# Altium schematic symbol library jlcpcb_2025_04_capacitors_extended_0402.schlib: 3594 symbols (part 11 of 20) (continued)
## CL05F104ZO5NNNC
designator C?  Capacitance: 100nF  (hidden comment: *)
Capacitor, Ceramic (MLCC), 100nF, 16V, Y5V, SMD 0402; Manufacturer: Samsung Electro-Mechanics; Manufacturer Part Number: CL05F104ZO5NNNC; Temperature Rating: -20%~+80%; Package Size: 0402; JLCPCB Basic Part: No; JLCPCB Part Number: C84701; Supplier 1: LCSC; Category: Capacitors - MLCC; Supplier Part Number 1: C84701; Voltage Rating: 16V; Temperature Coefficient: Y5V; RoHS: Yes; ComponentLink1Description: Datasheet; ComponentLink1URL: https://wmsc.lcsc.com/wmsc/upload/file/pdf/v2/lcsc/2304140030_Samsung-Electro-Mechanics-CL05F104ZO5NNNC_C84701.pdf; ComponentLink2Description: JLCPCB Part URL; ComponentLink2URL: https://jlcpcb.com/partdetail/C84701; ComponentLink3Description: LCSC Part URL; ComponentLink3URL: https://lcsc.com/product-detail/Multilayer-Ceramic-Capacitors-MLCC---SMD-SMT_Samsung-Electro-Mechanics-Samsung-Electro-Mechanics-CL05F104ZO5NNNC_C84701.html; ComponentLink4Description: Samsung Component Library; ComponentLink4URL: https://weblib.samsungsem.com/mlcc/mlcc-ec.do?partNumber=CL05F104ZO5NNN
footprint CAP-0402 (0402 (1005M) Capacitor)
pins: 1, 2

## CL05F224ZO5NNNC
designator C?  Capacitance: 220nF  (hidden comment: *)
Capacitor, Ceramic (MLCC), 220nF, 16V, Y5V, SMD 0402; Manufacturer: Samsung Electro-Mechanics; Manufacturer Part Number: CL05F224ZO5NNNC; Temperature Rating: -20%~+80%; Package Size: 0402; JLCPCB Basic Part: No; JLCPCB Part Number: C296712; Supplier 1: LCSC; Category: Capacitors - MLCC; Supplier Part Number 1: C296712; Voltage Rating: 16V; Temperature Coefficient: Y5V; RoHS: Yes; ComponentLink1Description: Datasheet; ComponentLink1URL: https://wmsc.lcsc.com/wmsc/upload/file/pdf/v2/lcsc/2304140030_Samsung-Electro-Mechanics-CL05F224ZO5NNNC_C296712.pdf; ComponentLink2Description: JLCPCB Part URL; ComponentLink2URL: https://jlcpcb.com/partdetail/C296712; ComponentLink3Description: LCSC Part URL; ComponentLink3URL: https://lcsc.com/product-detail/Multilayer-Ceramic-Capacitors-MLCC---SMD-SMT_Samsung-Electro-Mechanics-Samsung-Electro-Mechanics-CL05F224ZO5NNNC_C296712.html; ComponentLink4Description: Samsung Component Library; ComponentLink4URL: https://weblib.samsungsem.com/mlcc/mlcc-ec.do?partNumber=CL05F224ZO5NNN
footprint CAP-0402 (0402 (1005M) Capacitor)
pins: 1, 2

## CL05F224ZP5NNNC
designator C?  Capacitance: 220nF  (hidden comment: *)
Capacitor, Ceramic (MLCC), 220nF, 10V, Y5V, SMD 0402; Manufacturer: Samsung Electro-Mechanics; Manufacturer Part Number: CL05F224ZP5NNNC; Temperature Rating: -20%~+80%; Package Size: 0402; JLCPCB Basic Part: No; JLCPCB Part Number: C318602; Supplier 1: LCSC; Category: Capacitors - MLCC; Supplier Part Number 1: C318602; Voltage Rating: 10V; Temperature Coefficient: Y5V; RoHS: Yes; ComponentLink1Description: Datasheet; ComponentLink1URL: https://wmsc.lcsc.com/wmsc/upload/file/pdf/v2/lcsc/2304140030_Samsung-Electro-Mechanics-CL05F224ZP5NNNC_C318602.pdf; ComponentLink2Description: JLCPCB Part URL; ComponentLink2URL: https://jlcpcb.com/partdetail/C318602; ComponentLink3Description: LCSC Part URL; ComponentLink3URL: https://lcsc.com/product-detail/Multilayer-Ceramic-Capacitors-MLCC---SMD-SMT_Samsung-Electro-Mechanics-Samsung-Electro-Mechanics-CL05F224ZP5NNNC_C318602.html; ComponentLink4Description: Samsung Component Library; ComponentLink4URL: https://weblib.samsungsem.com/mlcc/mlcc-ec.do?partNumber=CL05F224ZP5NNN
footprint CAP-0402 (0402 (1005M) Capacitor)
pins: 1, 2

## CL05X105KA5NQNC
designator C?  Capacitance: 1uF  (hidden comment: *)
Capacitor, Ceramic (MLCC), 1uF, ±10%, 25V, X6S, ±10%, SMD 0402; Manufacturer: Samsung Electro-Mechanics; Manufacturer Part Number: CL05X105KA5NQNC; Package Size: 0402; JLCPCB Basic Part: No; JLCPCB Part Number: C307454; Supplier 1: LCSC; Category: Capacitors - MLCC; Supplier Part Number 1: C307454; Tolerance: ±10%; Voltage Rating: 25V; Temperature Coefficient: X6S; RoHS: Yes; ComponentLink1Description: Datasheet; ComponentLink1URL: https://wmsc.lcsc.com/wmsc/upload/file/pdf/v2/lcsc/2304140030_Samsung-Electro-Mechanics-CL05X105KA5NQNC_C307454.pdf; ComponentLink2Description: JLCPCB Part URL; ComponentLink2URL: https://jlcpcb.com/partdetail/C307454; ComponentLink3Description: LCSC Part URL; ComponentLink3URL: https://lcsc.com/product-detail/Multilayer-Ceramic-Capacitors-MLCC---SMD-SMT_Samsung-Electro-Mechanics-Samsung-Electro-Mechanics-CL05X105KA5NQNC_C307454.html; ComponentLink4Description: Samsung Component Library; ComponentLink4URL: https://weblib.samsungsem.com/mlcc/mlcc-ec.do?partNumber=CL05X105KA5NQN
footprint CAP-0402 (0402 (1005M) Capacitor)
pins: 1, 2

## CL05X105KP5NNNC
designator C?  Capacitance: 1uF  (hidden comment: *)
Capacitor, Ceramic (MLCC), 1uF, ±10%, 10V, X6S, ±10%, SMD 0402; Manufacturer: Samsung Electro-Mechanics; Manufacturer Part Number: CL05X105KP5NNNC; Package Size: 0402; JLCPCB Basic Part: No; JLCPCB Part Number: C2991800; Supplier 1: LCSC; Category: Capacitors - MLCC; Supplier Part Number 1: C2991800; Tolerance: ±10%; Voltage Rating: 10V; Temperature Coefficient: X6S; RoHS: Yes; ComponentLink1Description: Datasheet; ComponentLink1URL: https://wmsc.lcsc.com/wmsc/upload/file/pdf/v2/lcsc/2204111630_Samsung-Electro-Mechanics-CL05X105KP5NNNC_C2991800.pdf; ComponentLink2Description: JLCPCB Part URL; ComponentLink2URL: https://jlcpcb.com/partdetail/C2991800; ComponentLink3Description: LCSC Part URL; ComponentLink3URL: https://lcsc.com/product-detail/Multilayer-Ceramic-Capacitors-MLCC---SMD-SMT_Samsung-Electro-Mechanics-Samsung-Electro-Mechanics-CL05X105KP5NNNC_C2991800.html; ComponentLink4Description: Samsung Component Library; ComponentLink4URL: https://weblib.samsungsem.com/mlcc/mlcc-ec.do?partNumber=CL05X105KP5NNN
footprint CAP-0402 (0402 (1005M) Capacitor)
pins: 1, 2

## CL05X105KQ5NNNC
designator C?  Capacitance: 1uF  (hidden comment: *)
Capacitor, Ceramic (MLCC), 1uF, ±10%, 6.3V, X6S, ±10%, SMD 0402; Manufacturer: Samsung Electro-Mechanics; Manufacturer Part Number: CL05X105KQ5NNNC; Package Size: 0402; JLCPCB Basic Part: No; JLCPCB Part Number: C318566; Supplier 1: LCSC; Category: Capacitors - MLCC; Supplier Part Number 1: C318566; Tolerance: ±10%; Voltage Rating: 6.3V; Temperature Coefficient: X6S; RoHS: Yes; ComponentLink1Description: Datasheet; ComponentLink1URL: https://wmsc.lcsc.com/wmsc/upload/file/pdf/v2/lcsc/2309061404_Samsung-Electro-Mechanics-CL05X105KQ5NNNC_C318566.pdf; ComponentLink2Description: JLCPCB Part URL; ComponentLink2URL: https://jlcpcb.com/partdetail/C318566; ComponentLink3Description: LCSC Part URL; ComponentLink3URL: https://lcsc.com/product-detail/Multilayer-Ceramic-Capacitors-MLCC---SMD-SMT_Samsung-Electro-Mechanics-Samsung-Electro-Mechanics-CL05X105KQ5NNNC_C318566.html; ComponentLink4Description: Samsung Component Library; ComponentLink4URL: https://weblib.samsungsem.com/mlcc/mlcc-ec.do?partNumber=CL05X105KQ5NNN
footprint CAP-0402 (0402 (1005M) Capacitor)
pins: 1, 2

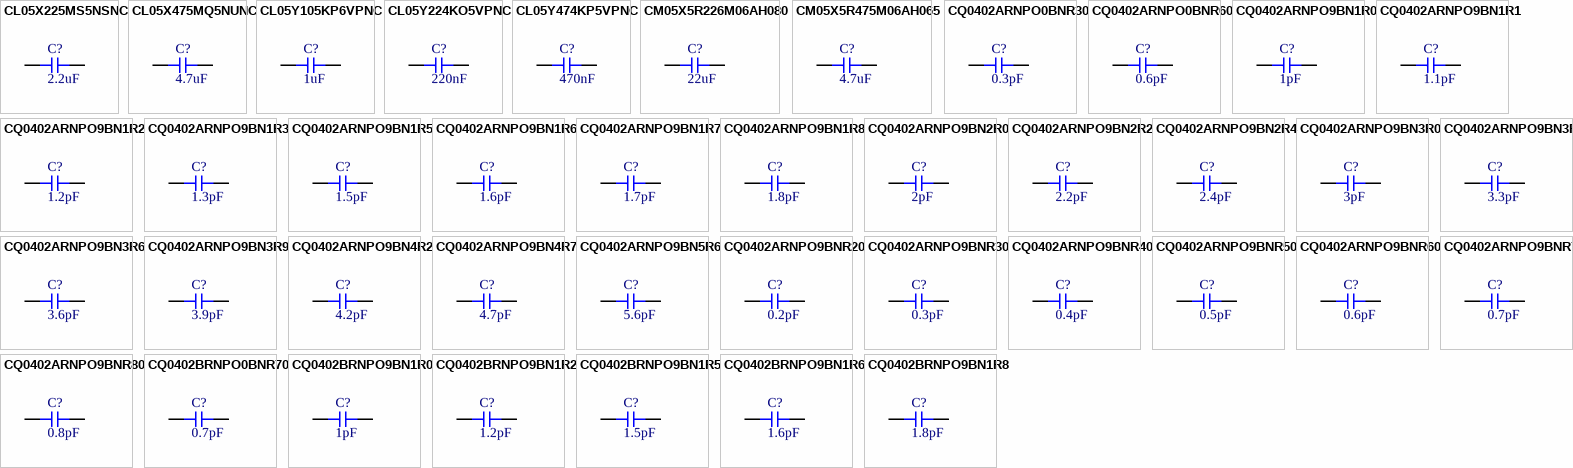
[diagram p49: symbols CL05X225MS5NSNC to CQ0402BRNPO9BN1R8]

## CL05X225MS5NSNC
designator C?  Capacitance: 2.2uF  (hidden comment: *)
Capacitor, Ceramic (MLCC), 2.2uF, ±20%, 2.5V, X6S, ±20%, SMD 0402; Manufacturer: Samsung Electro-Mechanics; Manufacturer Part Number: CL05X225MS5NSNC; Package Size: 0402; JLCPCB Basic Part: No; JLCPCB Part Number: C318565; Supplier 1: LCSC; Category: Capacitors - MLCC; Supplier Part Number 1: C318565; Tolerance: ±20%; Voltage Rating: 2.5V; Temperature Coefficient: X6S; RoHS: Yes; ComponentLink1Description: Datasheet; ComponentLink1URL: https://wmsc.lcsc.com/wmsc/upload/file/pdf/v2/lcsc/1912111437_Samsung-Electro-Mechanics-CL05X225MS5NSNC_C318565.pdf; ComponentLink2Description: JLCPCB Part URL; ComponentLink2URL: https://jlcpcb.com/partdetail/C318565; ComponentLink3Description: LCSC Part URL; ComponentLink3URL: https://lcsc.com/product-detail/Multilayer-Ceramic-Capacitors-MLCC---SMD-SMT_Samsung-Electro-Mechanics-Samsung-Electro-Mechanics-CL05X225MS5NSNC_C318565.html; ComponentLink4Description: Samsung Component Library; ComponentLink4URL: https://weblib.samsungsem.com/mlcc/mlcc-ec.do?partNumber=CL05X225MS5NSN
footprint CAP-0402 (0402 (1005M) Capacitor)
pins: 1, 2

## CL05X475MQ5NUNC
designator C?  Capacitance: 4.7uF  (hidden comment: *)
Capacitor, Ceramic (MLCC), 4.7uF, 6.3V, X6S, SMD 0402; Manufacturer: Samsung Electro-Mechanics; Manufacturer Part Number: CL05X475MQ5NUNC; Package Size: 0402; JLCPCB Basic Part: No; JLCPCB Part Number: C3039696; Supplier 1: LCSC; Category: Capacitors - MLCC; Supplier Part Number 1: C3039696; Voltage Rating: 6.3V; Temperature Coefficient: X6S; RoHS: Yes; ComponentLink1Description: Datasheet; ComponentLink1URL: https://wmsc.lcsc.com/wmsc/upload/file/pdf/v2/lcsc/2211141030_Samsung-Electro-Mechanics-CL05X475MQ5NUNC_C3039696.pdf; ComponentLink2Description: JLCPCB Part URL; ComponentLink2URL: https://jlcpcb.com/partdetail/C3039696; ComponentLink3Description: LCSC Part URL; ComponentLink3URL: https://lcsc.com/product-detail/Multilayer-Ceramic-Capacitors-MLCC---SMD-SMT_Samsung-Electro-Mechanics-Samsung-Electro-Mechanics-CL05X475MQ5NUNC_C3039696.html; ComponentLink4Description: Samsung Component Library; ComponentLink4URL: https://weblib.samsungsem.com/mlcc/mlcc-ec.do?partNumber=CL05X475MQ5NUN
footprint CAP-0402 (0402 (1005M) Capacitor)
pins: 1, 2

## CL05Y105KP6VPNC
designator C?  Capacitance: 1uF  (hidden comment: *)
Capacitor, Ceramic (MLCC), 1uF, ±10%, 10V, X7S, ±10%, SMD 0402; Manufacturer: Samsung Electro-Mechanics; Manufacturer Part Number: CL05Y105KP6VPNC; Package Size: 0402; JLCPCB Basic Part: No; JLCPCB Part Number: C2803380; Supplier 1: LCSC; Category: Capacitors - MLCC; Supplier Part Number 1: C2803380; Tolerance: ±10%; Voltage Rating: 10V; Temperature Coefficient: X7S; RoHS: Yes; ComponentLink1Description: Datasheet; ComponentLink1URL: https://wmsc.lcsc.com/wmsc/upload/file/pdf/v2/lcsc/2304140030_Samsung-Electro-Mechanics-CL05Y105KP6VPNC_C2803380.pdf; ComponentLink2Description: JLCPCB Part URL; ComponentLink2URL: https://jlcpcb.com/partdetail/C2803380; ComponentLink3Description: LCSC Part URL; ComponentLink3URL: https://lcsc.com/product-detail/Multilayer-Ceramic-Capacitors-MLCC---SMD-SMT_Samsung-Electro-Mechanics-Samsung-Electro-Mechanics-CL05Y105KP6VPNC_C2803380.html; ComponentLink4Description: Samsung Component Library; ComponentLink4URL: https://weblib.samsungsem.com/mlcc/mlcc-ec.do?partNumber=CL05Y105KP6VPN
footprint CAP-0402 (0402 (1005M) Capacitor)
pins: 1, 2

## CL05Y224KO5VPNC
designator C?  Capacitance: 220nF  (hidden comment: *)
Capacitor, Ceramic (MLCC), 220nF, ±10%, 16V, X7S, ±10%, SMD 0402; Manufacturer: Samsung Electro-Mechanics; Manufacturer Part Number: CL05Y224KO5VPNC; Package Size: 0402; JLCPCB Basic Part: No; JLCPCB Part Number: C472460; Supplier 1: LCSC; Category: Capacitors - MLCC; Supplier Part Number 1: C472460; Tolerance: ±10%; Voltage Rating: 16V; Temperature Coefficient: X7S; RoHS: Yes; ComponentLink1Description: Datasheet; ComponentLink1URL: https://wmsc.lcsc.com/wmsc/upload/file/pdf/v2/lcsc/2304140030_Samsung-Electro-Mechanics-CL05Y224KO5VPNC_C472460.pdf; ComponentLink2Description: JLCPCB Part URL; ComponentLink2URL: https://jlcpcb.com/partdetail/C472460; ComponentLink3Description: LCSC Part URL; ComponentLink3URL: https://lcsc.com/product-detail/Multilayer-Ceramic-Capacitors-MLCC---SMD-SMT_Samsung-Electro-Mechanics-Samsung-Electro-Mechanics-CL05Y224KO5VPNC_C472460.html; ComponentLink4Description: Samsung Component Library; ComponentLink4URL: https://weblib.samsungsem.com/mlcc/mlcc-ec.do?partNumber=CL05Y224KO5VPN
footprint CAP-0402 (0402 (1005M) Capacitor)
pins: 1, 2

## CL05Y474KP5VPNC
designator C?  Capacitance: 470nF  (hidden comment: *)
Capacitor, Ceramic (MLCC), 470nF, ±10%, 10V, X7S, ±10%, SMD 0402; Manufacturer: Samsung Electro-Mechanics; Manufacturer Part Number: CL05Y474KP5VPNC; Package Size: 0402; JLCPCB Basic Part: No; JLCPCB Part Number: C2803381; Supplier 1: LCSC; Category: Capacitors - MLCC; Supplier Part Number 1: C2803381; Tolerance: ±10%; Voltage Rating: 10V; Temperature Coefficient: X7S; RoHS: Yes; ComponentLink1Description: Datasheet; ComponentLink1URL: https://wmsc.lcsc.com/wmsc/upload/file/pdf/v2/lcsc/2304140030_Samsung-Electro-Mechanics-CL05Y474KP5VPNC_C2803381.pdf; ComponentLink2Description: JLCPCB Part URL; ComponentLink2URL: https://jlcpcb.com/partdetail/C2803381; ComponentLink3Description: LCSC Part URL; ComponentLink3URL: https://lcsc.com/product-detail/Multilayer-Ceramic-Capacitors-MLCC---SMD-SMT_Samsung-Electro-Mechanics-Samsung-Electro-Mechanics-CL05Y474KP5VPNC_C2803381.html; ComponentLink4Description: Samsung Component Library; ComponentLink4URL: https://weblib.samsungsem.com/mlcc/mlcc-ec.do?partNumber=CL05Y474KP5VPN
footprint CAP-0402 (0402 (1005M) Capacitor)
pins: 1, 2

## CM05X5R226M06AH080
designator C?  Capacitance: 22uF  (hidden comment: *)
Capacitor, Ceramic (MLCC), 22uF, ±20%, 6.3V, X5R, ±20%, SMD 0402; Manufacturer: Kyocera; Manufacturer Part Number: CM05X5R226M06AH080; Package Size: 0402; JLCPCB Basic Part: No; JLCPCB Part Number: C919306; Supplier 1: LCSC; Category: Capacitors - MLCC; Supplier Part Number 1: C919306; Tolerance: ±20%; Voltage Rating: 6.3V; Temperature Coefficient: X5R; RoHS: Yes; ComponentLink1Description: Datasheet; ComponentLink1URL: https://wmsc.lcsc.com/wmsc/upload/file/pdf/v2/lcsc/2108141630_Kyocera-AVX-CM05X5R226M06AH080_C919306.pdf; ComponentLink2Description: JLCPCB Part URL; ComponentLink2URL: https://jlcpcb.com/partdetail/C919306; ComponentLink3Description: LCSC Part URL; ComponentLink3URL: https://lcsc.com/product-detail/Multilayer-Ceramic-Capacitors-MLCC---SMD-SMT_Kyocera-AVX-Kyocera-AVX-CM05X5R226M06AH080_C919306.html
footprint CAP-0402 (0402 (1005M) Capacitor)
pins: 1, 2

## CM05X5R475M06AH065
designator C?  Capacitance: 4.7uF  (hidden comment: *)
Capacitor, Ceramic (MLCC), 4.7uF, ±20%, 6.3V, X5R, ±20%, SMD 0402; Manufacturer: Kyocera; Manufacturer Part Number: CM05X5R475M06AH065; Package Size: 0402; JLCPCB Basic Part: No; JLCPCB Part Number: C274416; Supplier 1: LCSC; Category: Capacitors - MLCC; Supplier Part Number 1: C274416; Tolerance: ±20%; Voltage Rating: 6.3V; Temperature Coefficient: X5R; RoHS: Yes; ComponentLink1Description: Datasheet; ComponentLink1URL: https://wmsc.lcsc.com/wmsc/upload/file/pdf/v2/lcsc/2007031717_Kyocera-AVX-CM05X5R475M06AH065_C274416.pdf; ComponentLink2Description: JLCPCB Part URL; ComponentLink2URL: https://jlcpcb.com/partdetail/C274416; ComponentLink3Description: LCSC Part URL; ComponentLink3URL: https://lcsc.com/product-detail/Multilayer-Ceramic-Capacitors-MLCC---SMD-SMT_Kyocera-AVX-Kyocera-AVX-CM05X5R475M06AH065_C274416.html
footprint CAP-0402 (0402 (1005M) Capacitor)
pins: 1, 2

## CQ0402ARNPO0BNR30
designator C?  Capacitance: 0.3pF  (hidden comment: *)
Capacitor, Ceramic (MLCC), 0.3pF, 100V, NP0, SMD 0402; Manufacturer: YAGEO; Manufacturer Part Number: CQ0402ARNPO0BNR30; Package Size: 0402; JLCPCB Basic Part: No; JLCPCB Part Number: C1855147; Supplier 1: LCSC; Category: Capacitors - MLCC; Supplier Part Number 1: C1855147; Voltage Rating: 100V; Temperature Coefficient: NP0; RoHS: Yes; ComponentLink1Description: Datasheet; ComponentLink1URL: https://wmsc.lcsc.com/wmsc/upload/file/pdf/v2/lcsc/2203081130_YAGEO-CQ0402ARNPO0BNR30_C1855147.pdf; ComponentLink2Description: JLCPCB Part URL; ComponentLink2URL: https://jlcpcb.com/partdetail/C1855147; ComponentLink3Description: LCSC Part URL; ComponentLink3URL: https://lcsc.com/product-detail/Multilayer-Ceramic-Capacitors-MLCC---SMD-SMT_YAGEO-YAGEO-CQ0402ARNPO0BNR30_C1855147.html
footprint CAP-0402 (0402 (1005M) Capacitor)
pins: 1, 2

## CQ0402ARNPO0BNR60
designator C?  Capacitance: 0.6pF  (hidden comment: *)
Capacitor, Ceramic (MLCC), 0.6pF, 100V, NP0, SMD 0402; Manufacturer: YAGEO; Manufacturer Part Number: CQ0402ARNPO0BNR60; Package Size: 0402; JLCPCB Basic Part: No; JLCPCB Part Number: C1855146; Supplier 1: LCSC; Category: Capacitors - MLCC; Supplier Part Number 1: C1855146; Voltage Rating: 100V; Temperature Coefficient: NP0; RoHS: Yes; ComponentLink1Description: Datasheet; ComponentLink1URL: https://wmsc.lcsc.com/wmsc/upload/file/pdf/v2/lcsc/2201271230_YAGEO-CQ0402ARNPO0BNR60_C1855146.pdf; ComponentLink2Description: JLCPCB Part URL; ComponentLink2URL: https://jlcpcb.com/partdetail/C1855146; ComponentLink3Description: LCSC Part URL; ComponentLink3URL: https://lcsc.com/product-detail/Multilayer-Ceramic-Capacitors-MLCC---SMD-SMT_YAGEO-YAGEO-CQ0402ARNPO0BNR60_C1855146.html
footprint CAP-0402 (0402 (1005M) Capacitor)
pins: 1, 2

## CQ0402ARNPO9BN1R0
designator C?  Capacitance: 1pF  (hidden comment: *)
Capacitor, Ceramic (MLCC), 1pF, 50V, NP0, SMD 0402; Manufacturer: YAGEO; Manufacturer Part Number: CQ0402ARNPO9BN1R0; Package Size: 0402; JLCPCB Basic Part: No; JLCPCB Part Number: C326062; Supplier 1: LCSC; Category: Capacitors - MLCC; Supplier Part Number 1: C326062; Voltage Rating: 50V; Temperature Coefficient: NP0; RoHS: Yes; ComponentLink1Description: Datasheet; ComponentLink1URL: https://wmsc.lcsc.com/wmsc/upload/file/pdf/v2/lcsc/1811070918_YAGEO-CQ0402ARNPO9BN1R0_C326062.pdf; ComponentLink2Description: JLCPCB Part URL; ComponentLink2URL: https://jlcpcb.com/partdetail/C326062; ComponentLink3Description: LCSC Part URL; ComponentLink3URL: https://lcsc.com/product-detail/Multilayer-Ceramic-Capacitors-MLCC---SMD-SMT_YAGEO-YAGEO-CQ0402ARNPO9BN1R0_C326062.html
footprint CAP-0402 (0402 (1005M) Capacitor)
pins: 1, 2

## CQ0402ARNPO9BN1R1
designator C?  Capacitance: 1.1pF  (hidden comment: *)
Capacitor, Ceramic (MLCC), 1.1pF, 50V, SMD 0402; Manufacturer: YAGEO; Manufacturer Part Number: CQ0402ARNPO9BN1R1; Package Size: 0402; JLCPCB Basic Part: No; JLCPCB Part Number: C2209626; Supplier 1: LCSC; Category: Capacitors - MLCC; Supplier Part Number 1: C2209626; Voltage Rating: 50V; RoHS: Yes; ComponentLink1Description: Datasheet; ComponentLink1URL: https://wmsc.lcsc.com/wmsc/upload/file/pdf/v2/lcsc/2304140030_YAGEO-CQ0402ARNPO9BN1R1_C2209626.pdf; ComponentLink2Description: JLCPCB Part URL; ComponentLink2URL: https://jlcpcb.com/partdetail/C2209626; ComponentLink3Description: LCSC Part URL; ComponentLink3URL: https://lcsc.com/product-detail/Multilayer-Ceramic-Capacitors-MLCC---SMD-SMT_YAGEO-YAGEO-CQ0402ARNPO9BN1R1_C2209626.html
footprint CAP-0402 (0402 (1005M) Capacitor)
pins: 1, 2

## CQ0402ARNPO9BN1R2
designator C?  Capacitance: 1.2pF  (hidden comment: *)
Capacitor, Ceramic (MLCC), 1.2pF, 50V, NP0, SMD 0402; Manufacturer: YAGEO; Manufacturer Part Number: CQ0402ARNPO9BN1R2; Package Size: 0402; JLCPCB Basic Part: No; JLCPCB Part Number: C326063; Supplier 1: LCSC; Category: Capacitors - MLCC; Supplier Part Number 1: C326063; Voltage Rating: 50V; Temperature Coefficient: NP0; RoHS: Yes; ComponentLink1Description: Datasheet; ComponentLink1URL: https://wmsc.lcsc.com/wmsc/upload/file/pdf/v2/lcsc/1811070918_YAGEO-CQ0402ARNPO9BN1R2_C326063.pdf; ComponentLink2Description: JLCPCB Part URL; ComponentLink2URL: https://jlcpcb.com/partdetail/C326063; ComponentLink3Description: LCSC Part URL; ComponentLink3URL: https://lcsc.com/product-detail/Multilayer-Ceramic-Capacitors-MLCC---SMD-SMT_YAGEO-YAGEO-CQ0402ARNPO9BN1R2_C326063.html
footprint CAP-0402 (0402 (1005M) Capacitor)
pins: 1, 2

## CQ0402ARNPO9BN1R3
designator C?  Capacitance: 1.3pF  (hidden comment: *)
Capacitor, Ceramic (MLCC), 1.3pF, 50V, NP0, SMD 0402; Manufacturer: YAGEO; Manufacturer Part Number: CQ0402ARNPO9BN1R3; Package Size: 0402; JLCPCB Basic Part: No; JLCPCB Part Number: C2209812; Supplier 1: LCSC; Category: Capacitors - MLCC; Supplier Part Number 1: C2209812; Voltage Rating: 50V; Temperature Coefficient: NP0; RoHS: Yes; ComponentLink1Description: Datasheet; ComponentLink1URL: https://wmsc.lcsc.com/wmsc/upload/file/pdf/v2/lcsc/2304140030_YAGEO-CQ0402ARNPO9BN1R3_C2209812.pdf; ComponentLink2Description: JLCPCB Part URL; ComponentLink2URL: https://jlcpcb.com/partdetail/C2209812; ComponentLink3Description: LCSC Part URL; ComponentLink3URL: https://lcsc.com/product-detail/Multilayer-Ceramic-Capacitors-MLCC---SMD-SMT_YAGEO-YAGEO-CQ0402ARNPO9BN1R3_C2209812.html
footprint CAP-0402 (0402 (1005M) Capacitor)
pins: 1, 2

## CQ0402ARNPO9BN1R5
designator C?  Capacitance: 1.5pF  (hidden comment: *)
Capacitor, Ceramic (MLCC), 1.5pF, 50V, SMD 0402; Manufacturer: YAGEO; Manufacturer Part Number: CQ0402ARNPO9BN1R5; Package Size: 0402; JLCPCB Basic Part: No; JLCPCB Part Number: C326064; Supplier 1: LCSC; Category: Capacitors - MLCC; Supplier Part Number 1: C326064; Voltage Rating: 50V; RoHS: Yes; ComponentLink1Description: Datasheet; ComponentLink1URL: https://wmsc.lcsc.com/wmsc/upload/file/pdf/v2/lcsc/1811070918_YAGEO-CQ0402ARNPO9BN1R5_C326064.pdf; ComponentLink2Description: JLCPCB Part URL; ComponentLink2URL: https://jlcpcb.com/partdetail/C326064; ComponentLink3Description: LCSC Part URL; ComponentLink3URL: https://lcsc.com/product-detail/Multilayer-Ceramic-Capacitors-MLCC---SMD-SMT_YAGEO-YAGEO-CQ0402ARNPO9BN1R5_C326064.html
footprint CAP-0402 (0402 (1005M) Capacitor)
pins: 1, 2

## CQ0402ARNPO9BN1R6
designator C?  Capacitance: 1.6pF  (hidden comment: *)
Capacitor, Ceramic (MLCC), 1.6pF, 50V, NP0, SMD 0402; Manufacturer: YAGEO; Manufacturer Part Number: CQ0402ARNPO9BN1R6; Package Size: 0402; JLCPCB Basic Part: No; JLCPCB Part Number: C2210913; Supplier 1: LCSC; Category: Capacitors - MLCC; Supplier Part Number 1: C2210913; Voltage Rating: 50V; Temperature Coefficient: NP0; RoHS: Yes; ComponentLink1Description: Datasheet; ComponentLink1URL: https://wmsc.lcsc.com/wmsc/upload/file/pdf/v2/lcsc/2304140030_YAGEO-CQ0402ARNPO9BN1R6_C2210913.pdf; ComponentLink2Description: JLCPCB Part URL; ComponentLink2URL: https://jlcpcb.com/partdetail/C2210913; ComponentLink3Description: LCSC Part URL; ComponentLink3URL: https://lcsc.com/product-detail/Multilayer-Ceramic-Capacitors-MLCC---SMD-SMT_YAGEO-YAGEO-CQ0402ARNPO9BN1R6_C2210913.html
footprint CAP-0402 (0402 (1005M) Capacitor)
pins: 1, 2

## CQ0402ARNPO9BN1R7
designator C?  Capacitance: 1.7pF  (hidden comment: *)
Capacitor, Ceramic (MLCC), 1.7pF, 50V, NP0, SMD 0402; Manufacturer: YAGEO; Manufacturer Part Number: CQ0402ARNPO9BN1R7; Package Size: 0402; JLCPCB Basic Part: No; JLCPCB Part Number: C1855333; Supplier 1: LCSC; Category: Capacitors - MLCC; Supplier Part Number 1: C1855333; Voltage Rating: 50V; Temperature Coefficient: NP0; RoHS: Yes; ComponentLink1Description: Datasheet; ComponentLink1URL: https://wmsc.lcsc.com/wmsc/upload/file/pdf/v2/lcsc/2112231430_YAGEO-CQ0402ARNPO9BN1R7_C1855333.pdf; ComponentLink2Description: JLCPCB Part URL; ComponentLink2URL: https://jlcpcb.com/partdetail/C1855333; ComponentLink3Description: LCSC Part URL; ComponentLink3URL: https://lcsc.com/product-detail/Multilayer-Ceramic-Capacitors-MLCC---SMD-SMT_YAGEO-YAGEO-CQ0402ARNPO9BN1R7_C1855333.html
footprint CAP-0402 (0402 (1005M) Capacitor)
pins: 1, 2

## CQ0402ARNPO9BN1R8
designator C?  Capacitance: 1.8pF  (hidden comment: *)
Capacitor, Ceramic (MLCC), 1.8pF, 50V, NP0, SMD 0402; Manufacturer: YAGEO; Manufacturer Part Number: CQ0402ARNPO9BN1R8; Package Size: 0402; JLCPCB Basic Part: No; JLCPCB Part Number: C2208875; Supplier 1: LCSC; Category: Capacitors - MLCC; Supplier Part Number 1: C2208875; Voltage Rating: 50V; Temperature Coefficient: NP0; RoHS: Yes; ComponentLink1Description: Datasheet; ComponentLink1URL: https://wmsc.lcsc.com/wmsc/upload/file/pdf/v2/lcsc/2304140030_YAGEO-CQ0402ARNPO9BN1R8_C2208875.pdf; ComponentLink2Description: JLCPCB Part URL; ComponentLink2URL: https://jlcpcb.com/partdetail/C2208875; ComponentLink3Description: LCSC Part URL; ComponentLink3URL: https://lcsc.com/product-detail/Multilayer-Ceramic-Capacitors-MLCC---SMD-SMT_YAGEO-YAGEO-CQ0402ARNPO9BN1R8_C2208875.html
footprint CAP-0402 (0402 (1005M) Capacitor)
pins: 1, 2

## CQ0402ARNPO9BN2R0
designator C?  Capacitance: 2pF  (hidden comment: *)
Capacitor, Ceramic (MLCC), 2pF, 50V, SMD 0402; Manufacturer: YAGEO; Manufacturer Part Number: CQ0402ARNPO9BN2R0; Package Size: 0402; JLCPCB Basic Part: No; JLCPCB Part Number: C326065; Supplier 1: LCSC; Category: Capacitors - MLCC; Supplier Part Number 1: C326065; Voltage Rating: 50V; RoHS: Yes; ComponentLink1Description: Datasheet; ComponentLink1URL: https://wmsc.lcsc.com/wmsc/upload/file/pdf/v2/lcsc/1811070918_YAGEO-CQ0402ARNPO9BN2R0_C326065.pdf; ComponentLink2Description: JLCPCB Part URL; ComponentLink2URL: https://jlcpcb.com/partdetail/C326065; ComponentLink3Description: LCSC Part URL; ComponentLink3URL: https://lcsc.com/product-detail/Multilayer-Ceramic-Capacitors-MLCC---SMD-SMT_YAGEO-YAGEO-CQ0402ARNPO9BN2R0_C326065.html
footprint CAP-0402 (0402 (1005M) Capacitor)
pins: 1, 2

## CQ0402ARNPO9BN2R2
designator C?  Capacitance: 2.2pF  (hidden comment: *)
Capacitor, Ceramic (MLCC), 2.2pF, 50V, NP0, SMD 0402; Manufacturer: YAGEO; Manufacturer Part Number: CQ0402ARNPO9BN2R2; Package Size: 0402; JLCPCB Basic Part: No; JLCPCB Part Number: C1855361; Supplier 1: LCSC; Category: Capacitors - MLCC; Supplier Part Number 1: C1855361; Voltage Rating: 50V; Temperature Coefficient: NP0; RoHS: Yes; ComponentLink1Description: Datasheet; ComponentLink1URL: https://wmsc.lcsc.com/wmsc/upload/file/pdf/v2/lcsc/2201271230_YAGEO-CQ0402ARNPO9BN2R2_C1855361.pdf; ComponentLink2Description: JLCPCB Part URL; ComponentLink2URL: https://jlcpcb.com/partdetail/C1855361; ComponentLink3Description: LCSC Part URL; ComponentLink3URL: https://lcsc.com/product-detail/Multilayer-Ceramic-Capacitors-MLCC---SMD-SMT_YAGEO-YAGEO-CQ0402ARNPO9BN2R2_C1855361.html
footprint CAP-0402 (0402 (1005M) Capacitor)
pins: 1, 2

## CQ0402ARNPO9BN2R4
designator C?  Capacitance: 2.4pF  (hidden comment: *)
Capacitor, Ceramic (MLCC), 2.4pF, 50V, NP0, SMD 0402; Manufacturer: YAGEO; Manufacturer Part Number: CQ0402ARNPO9BN2R4; Package Size: 0402; JLCPCB Basic Part: No; JLCPCB Part Number: C326066; Supplier 1: LCSC; Category: Capacitors - MLCC; Supplier Part Number 1: C326066; Voltage Rating: 50V; Temperature Coefficient: NP0; RoHS: Yes; ComponentLink1Description: Datasheet; ComponentLink1URL: https://wmsc.lcsc.com/wmsc/upload/file/pdf/v2/lcsc/1811070918_YAGEO-CQ0402ARNPO9BN2R4_C326066.pdf; ComponentLink2Description: JLCPCB Part URL; ComponentLink2URL: https://jlcpcb.com/partdetail/C326066; ComponentLink3Description: LCSC Part URL; ComponentLink3URL: https://lcsc.com/product-detail/Multilayer-Ceramic-Capacitors-MLCC---SMD-SMT_YAGEO-YAGEO-CQ0402ARNPO9BN2R4_C326066.html
footprint CAP-0402 (0402 (1005M) Capacitor)
pins: 1, 2

## CQ0402ARNPO9BN3R0
designator C?  Capacitance: 3pF  (hidden comment: *)
Capacitor, Ceramic (MLCC), 3pF, 50V, NP0, SMD 0402; Manufacturer: YAGEO; Manufacturer Part Number: CQ0402ARNPO9BN3R0; Package Size: 0402; JLCPCB Basic Part: No; JLCPCB Part Number: C1855338; Supplier 1: LCSC; Category: Capacitors - MLCC; Supplier Part Number 1: C1855338; Voltage Rating: 50V; Temperature Coefficient: NP0; RoHS: Yes; ComponentLink1Description: Datasheet; ComponentLink1URL: https://wmsc.lcsc.com/wmsc/upload/file/pdf/v2/lcsc/2201271230_YAGEO-CQ0402ARNPO9BN3R0_C1855338.pdf; ComponentLink2Description: JLCPCB Part URL; ComponentLink2URL: https://jlcpcb.com/partdetail/C1855338; ComponentLink3Description: LCSC Part URL; ComponentLink3URL: https://lcsc.com/product-detail/Multilayer-Ceramic-Capacitors-MLCC---SMD-SMT_YAGEO-YAGEO-CQ0402ARNPO9BN3R0_C1855338.html
footprint CAP-0402 (0402 (1005M) Capacitor)
pins: 1, 2

## CQ0402ARNPO9BN3R3
designator C?  Capacitance: 3.3pF  (hidden comment: *)
Capacitor, Ceramic (MLCC), 3.3pF, 50V, C0G, SMD 0402; Manufacturer: YAGEO; Manufacturer Part Number: CQ0402ARNPO9BN3R3; Package Size: 0402; JLCPCB Basic Part: No; JLCPCB Part Number: C3838982; Supplier 1: LCSC; Category: Capacitors - MLCC; Supplier Part Number 1: C3838982; Voltage Rating: 50V; Temperature Coefficient: C0G; RoHS: Yes; ComponentLink1Description: Datasheet; ComponentLink1URL: https://wmsc.lcsc.com/wmsc/upload/file/pdf/v2/lcsc/2311211124_YAGEO-CQ0402ARNPO9BN3R3_C3838982.pdf; ComponentLink2Description: JLCPCB Part URL; ComponentLink2URL: https://jlcpcb.com/partdetail/C3838982; ComponentLink3Description: LCSC Part URL; ComponentLink3URL: https://lcsc.com/product-detail/Multilayer-Ceramic-Capacitors-MLCC---SMD-SMT_YAGEO-YAGEO-CQ0402ARNPO9BN3R3_C3838982.html
footprint CAP-0402 (0402 (1005M) Capacitor)
pins: 1, 2

## CQ0402ARNPO9BN3R6
designator C?  Capacitance: 3.6pF  (hidden comment: *)
Capacitor, Ceramic (MLCC), 3.6pF, 50V, C0G, SMD 0402; Manufacturer: YAGEO; Manufacturer Part Number: CQ0402ARNPO9BN3R6; Package Size: 0402; JLCPCB Basic Part: No; JLCPCB Part Number: C3856941; Supplier 1: LCSC; Category: Capacitors - MLCC; Supplier Part Number 1: C3856941; Voltage Rating: 50V; Temperature Coefficient: C0G; RoHS: Yes; ComponentLink1Description: Datasheet; ComponentLink1URL: https://wmsc.lcsc.com/wmsc/upload/file/pdf/v2/lcsc/2311211124_YAGEO-CQ0402ARNPO9BN3R6_C3856941.pdf; ComponentLink2Description: JLCPCB Part URL; ComponentLink2URL: https://jlcpcb.com/partdetail/C3856941; ComponentLink3Description: LCSC Part URL; ComponentLink3URL: https://lcsc.com/product-detail/Multilayer-Ceramic-Capacitors-MLCC---SMD-SMT_YAGEO-YAGEO-CQ0402ARNPO9BN3R6_C3856941.html
footprint CAP-0402 (0402 (1005M) Capacitor)
pins: 1, 2

## CQ0402ARNPO9BN3R9
designator C?  Capacitance: 3.9pF  (hidden comment: *)
Capacitor, Ceramic (MLCC), 3.9pF, 50V, NP0, SMD 0402; Manufacturer: YAGEO; Manufacturer Part Number: CQ0402ARNPO9BN3R9; Package Size: 0402; JLCPCB Basic Part: No; JLCPCB Part Number: C1855334; Supplier 1: LCSC; Category: Capacitors - MLCC; Supplier Part Number 1: C1855334; Voltage Rating: 50V; Temperature Coefficient: NP0; RoHS: Yes; ComponentLink1Description: Datasheet; ComponentLink1URL: https://wmsc.lcsc.com/wmsc/upload/file/pdf/v2/lcsc/2201271230_YAGEO-CQ0402ARNPO9BN3R9_C1855334.pdf; ComponentLink2Description: JLCPCB Part URL; ComponentLink2URL: https://jlcpcb.com/partdetail/C1855334; ComponentLink3Description: LCSC Part URL; ComponentLink3URL: https://lcsc.com/product-detail/Multilayer-Ceramic-Capacitors-MLCC---SMD-SMT_YAGEO-YAGEO-CQ0402ARNPO9BN3R9_C1855334.html
footprint CAP-0402 (0402 (1005M) Capacitor)
pins: 1, 2

## CQ0402ARNPO9BN4R2
designator C?  Capacitance: 4.2pF  (hidden comment: *)
Capacitor, Ceramic (MLCC), 4.2pF, 50V, NP0, SMD 0402; Manufacturer: YAGEO; Manufacturer Part Number: CQ0402ARNPO9BN4R2; Package Size: 0402; JLCPCB Basic Part: No; JLCPCB Part Number: C1855356; Supplier 1: LCSC; Category: Capacitors - MLCC; Supplier Part Number 1: C1855356; Voltage Rating: 50V; Temperature Coefficient: NP0; RoHS: Yes; ComponentLink1Description: Datasheet; ComponentLink1URL: https://wmsc.lcsc.com/wmsc/upload/file/pdf/v2/lcsc/2201271230_YAGEO-CQ0402ARNPO9BN4R2_C1855356.pdf; ComponentLink2Description: JLCPCB Part URL; ComponentLink2URL: https://jlcpcb.com/partdetail/C1855356; ComponentLink3Description: LCSC Part URL; ComponentLink3URL: https://lcsc.com/product-detail/Multilayer-Ceramic-Capacitors-MLCC---SMD-SMT_YAGEO-YAGEO-CQ0402ARNPO9BN4R2_C1855356.html
footprint CAP-0402 (0402 (1005M) Capacitor)
pins: 1, 2

## CQ0402ARNPO9BN4R7
designator C?  Capacitance: 4.7pF  (hidden comment: *)
Capacitor, Ceramic (MLCC), 4.7pF, 50V, NP0, SMD 0402; Manufacturer: YAGEO; Manufacturer Part Number: CQ0402ARNPO9BN4R7; Package Size: 0402; JLCPCB Basic Part: No; JLCPCB Part Number: C1855336; Supplier 1: LCSC; Category: Capacitors - MLCC; Supplier Part Number 1: C1855336; Voltage Rating: 50V; Temperature Coefficient: NP0; RoHS: Yes; ComponentLink1Description: Datasheet; ComponentLink1URL: https://wmsc.lcsc.com/wmsc/upload/file/pdf/v2/lcsc/2201271230_YAGEO-CQ0402ARNPO9BN4R7_C1855336.pdf; ComponentLink2Description: JLCPCB Part URL; ComponentLink2URL: https://jlcpcb.com/partdetail/C1855336; ComponentLink3Description: LCSC Part URL; ComponentLink3URL: https://lcsc.com/product-detail/Multilayer-Ceramic-Capacitors-MLCC---SMD-SMT_YAGEO-YAGEO-CQ0402ARNPO9BN4R7_C1855336.html
footprint CAP-0402 (0402 (1005M) Capacitor)
pins: 1, 2

## CQ0402ARNPO9BN5R6
designator C?  Capacitance: 5.6pF  (hidden comment: *)
Capacitor, Ceramic (MLCC), 5.6pF, 50V, NP0, SMD 0402; Manufacturer: YAGEO; Manufacturer Part Number: CQ0402ARNPO9BN5R6; Package Size: 0402; JLCPCB Basic Part: No; JLCPCB Part Number: C1855385; Supplier 1: LCSC; Category: Capacitors - MLCC; Supplier Part Number 1: C1855385; Voltage Rating: 50V; Temperature Coefficient: NP0; RoHS: Yes; ComponentLink1Description: Datasheet; ComponentLink1URL: https://wmsc.lcsc.com/wmsc/upload/file/pdf/v2/lcsc/2201271230_YAGEO-CQ0402ARNPO9BN5R6_C1855385.pdf; ComponentLink2Description: JLCPCB Part URL; ComponentLink2URL: https://jlcpcb.com/partdetail/C1855385; ComponentLink3Description: LCSC Part URL; ComponentLink3URL: https://lcsc.com/product-detail/Multilayer-Ceramic-Capacitors-MLCC---SMD-SMT_YAGEO-YAGEO-CQ0402ARNPO9BN5R6_C1855385.html
footprint CAP-0402 (0402 (1005M) Capacitor)
pins: 1, 2

## CQ0402ARNPO9BNR20
designator C?  Capacitance: 0.2pF  (hidden comment: *)
Capacitor, Ceramic (MLCC), 0.2pF, 50V, NP0, SMD 0402; Manufacturer: YAGEO; Manufacturer Part Number: CQ0402ARNPO9BNR20; Package Size: 0402; JLCPCB Basic Part: No; JLCPCB Part Number: C326067; Supplier 1: LCSC; Category: Capacitors - MLCC; Supplier Part Number 1: C326067; Voltage Rating: 50V; Temperature Coefficient: NP0; RoHS: Yes; ComponentLink1Description: Datasheet; ComponentLink1URL: https://wmsc.lcsc.com/wmsc/upload/file/pdf/v2/lcsc/1811031143_YAGEO-CQ0402ARNPO9BNR20_C326067.pdf; ComponentLink2Description: JLCPCB Part URL; ComponentLink2URL: https://jlcpcb.com/partdetail/C326067; ComponentLink3Description: LCSC Part URL; ComponentLink3URL: https://lcsc.com/product-detail/Multilayer-Ceramic-Capacitors-MLCC---SMD-SMT_YAGEO-YAGEO-CQ0402ARNPO9BNR20_C326067.html
footprint CAP-0402 (0402 (1005M) Capacitor)
pins: 1, 2

## CQ0402ARNPO9BNR30
designator C?  Capacitance: 0.3pF  (hidden comment: *)
Capacitor, Ceramic (MLCC), 0.3pF, 50V, NP0, SMD 0402; Manufacturer: YAGEO; Manufacturer Part Number: CQ0402ARNPO9BNR30; Package Size: 0402; JLCPCB Basic Part: No; JLCPCB Part Number: C1870422; Supplier 1: LCSC; Category: Capacitors - MLCC; Supplier Part Number 1: C1870422; Voltage Rating: 50V; Temperature Coefficient: NP0; RoHS: Yes; ComponentLink1Description: Datasheet; ComponentLink1URL: https://wmsc.lcsc.com/wmsc/upload/file/pdf/v2/lcsc/2103221534_YAGEO-CQ0402ARNPO9BNR30_C1870422.pdf; ComponentLink2Description: JLCPCB Part URL; ComponentLink2URL: https://jlcpcb.com/partdetail/C1870422; ComponentLink3Description: LCSC Part URL; ComponentLink3URL: https://lcsc.com/product-detail/Multilayer-Ceramic-Capacitors-MLCC---SMD-SMT_YAGEO-YAGEO-CQ0402ARNPO9BNR30_C1870422.html
footprint CAP-0402 (0402 (1005M) Capacitor)
pins: 1, 2

## CQ0402ARNPO9BNR40
designator C?  Capacitance: 0.4pF  (hidden comment: *)
Capacitor, Ceramic (MLCC), 0.4pF, 50V, NP0, SMD 0402; Manufacturer: YAGEO; Manufacturer Part Number: CQ0402ARNPO9BNR40; Package Size: 0402; JLCPCB Basic Part: No; JLCPCB Part Number: C2228109; Supplier 1: LCSC; Category: Capacitors - MLCC; Supplier Part Number 1: C2228109; Voltage Rating: 50V; Temperature Coefficient: NP0; RoHS: Yes; ComponentLink1Description: Datasheet; ComponentLink1URL: https://wmsc.lcsc.com/wmsc/upload/file/pdf/v2/lcsc/2304140030_YAGEO-CQ0402ARNPO9BNR40_C2228109.pdf; ComponentLink2Description: JLCPCB Part URL; ComponentLink2URL: https://jlcpcb.com/partdetail/C2228109; ComponentLink3Description: LCSC Part URL; ComponentLink3URL: https://lcsc.com/product-detail/Multilayer-Ceramic-Capacitors-MLCC---SMD-SMT_YAGEO-YAGEO-CQ0402ARNPO9BNR40_C2228109.html
footprint CAP-0402 (0402 (1005M) Capacitor)
pins: 1, 2

## CQ0402ARNPO9BNR50
designator C?  Capacitance: 0.5pF  (hidden comment: *)
Capacitor, Ceramic (MLCC), 0.5pF, 50V, NP0, SMD 0402; Manufacturer: YAGEO; Manufacturer Part Number: CQ0402ARNPO9BNR50; Package Size: 0402; JLCPCB Basic Part: No; JLCPCB Part Number: C1882763; Supplier 1: LCSC; Category: Capacitors - MLCC; Supplier Part Number 1: C1882763; Voltage Rating: 50V; Temperature Coefficient: NP0; RoHS: Yes; ComponentLink1Description: Datasheet; ComponentLink1URL: https://wmsc.lcsc.com/wmsc/upload/file/pdf/v2/lcsc/2203221230_YAGEO-CQ0402ARNPO9BNR50_C1882763.pdf; ComponentLink2Description: JLCPCB Part URL; ComponentLink2URL: https://jlcpcb.com/partdetail/C1882763; ComponentLink3Description: LCSC Part URL; ComponentLink3URL: https://lcsc.com/product-detail/Multilayer-Ceramic-Capacitors-MLCC---SMD-SMT_YAGEO-YAGEO-CQ0402ARNPO9BNR50_C1882763.html
footprint CAP-0402 (0402 (1005M) Capacitor)
pins: 1, 2

## CQ0402ARNPO9BNR60
designator C?  Capacitance: 0.6pF  (hidden comment: *)
Capacitor, Ceramic (MLCC), 0.6pF, 50V, NP0, SMD 0402; Manufacturer: YAGEO; Manufacturer Part Number: CQ0402ARNPO9BNR60; Package Size: 0402; JLCPCB Basic Part: No; JLCPCB Part Number: C2220056; Supplier 1: LCSC; Category: Capacitors - MLCC; Supplier Part Number 1: C2220056; Voltage Rating: 50V; Temperature Coefficient: NP0; RoHS: Yes; ComponentLink1Description: Datasheet; ComponentLink1URL: https://wmsc.lcsc.com/wmsc/upload/file/pdf/v2/lcsc/2304140030_YAGEO-CQ0402ARNPO9BNR60_C2220056.pdf; ComponentLink2Description: JLCPCB Part URL; ComponentLink2URL: https://jlcpcb.com/partdetail/C2220056; ComponentLink3Description: LCSC Part URL; ComponentLink3URL: https://lcsc.com/product-detail/Multilayer-Ceramic-Capacitors-MLCC---SMD-SMT_YAGEO-YAGEO-CQ0402ARNPO9BNR60_C2220056.html
footprint CAP-0402 (0402 (1005M) Capacitor)
pins: 1, 2

## CQ0402ARNPO9BNR70
designator C?  Capacitance: 0.7pF  (hidden comment: *)
Capacitor, Ceramic (MLCC), 0.7pF, 50V, NP0, SMD 0402; Manufacturer: YAGEO; Manufacturer Part Number: CQ0402ARNPO9BNR70; Package Size: 0402; JLCPCB Basic Part: No; JLCPCB Part Number: C2208879; Supplier 1: LCSC; Category: Capacitors - MLCC; Supplier Part Number 1: C2208879; Voltage Rating: 50V; Temperature Coefficient: NP0; RoHS: Yes; ComponentLink1Description: Datasheet; ComponentLink1URL: https://wmsc.lcsc.com/wmsc/upload/file/pdf/v2/lcsc/2304140030_YAGEO-CQ0402ARNPO9BNR70_C2208879.pdf; ComponentLink2Description: JLCPCB Part URL; ComponentLink2URL: https://jlcpcb.com/partdetail/C2208879; ComponentLink3Description: LCSC Part URL; ComponentLink3URL: https://lcsc.com/product-detail/Multilayer-Ceramic-Capacitors-MLCC---SMD-SMT_YAGEO-YAGEO-CQ0402ARNPO9BNR70_C2208879.html
footprint CAP-0402 (0402 (1005M) Capacitor)
pins: 1, 2

## CQ0402ARNPO9BNR80
designator C?  Capacitance: 0.8pF  (hidden comment: *)
Capacitor, Ceramic (MLCC), 0.8pF, 50V, NP0, SMD 0402; Manufacturer: YAGEO; Manufacturer Part Number: CQ0402ARNPO9BNR80; Package Size: 0402; JLCPCB Basic Part: No; JLCPCB Part Number: C326068; Supplier 1: LCSC; Category: Capacitors - MLCC; Supplier Part Number 1: C326068; Voltage Rating: 50V; Temperature Coefficient: NP0; RoHS: Yes; ComponentLink1Description: Datasheet; ComponentLink1URL: https://wmsc.lcsc.com/wmsc/upload/file/pdf/v2/lcsc/1811070918_YAGEO-CQ0402ARNPO9BNR80_C326068.pdf; ComponentLink2Description: JLCPCB Part URL; ComponentLink2URL: https://jlcpcb.com/partdetail/C326068; ComponentLink3Description: LCSC Part URL; ComponentLink3URL: https://lcsc.com/product-detail/Multilayer-Ceramic-Capacitors-MLCC---SMD-SMT_YAGEO-YAGEO-CQ0402ARNPO9BNR80_C326068.html
footprint CAP-0402 (0402 (1005M) Capacitor)
pins: 1, 2

## CQ0402BRNPO0BNR70
designator C?  Capacitance: 0.7pF  (hidden comment: *)
Capacitor, Ceramic (MLCC), 0.7pF, 100V, NP0, SMD 0402; Manufacturer: YAGEO; Manufacturer Part Number: CQ0402BRNPO0BNR70; Package Size: 0402; JLCPCB Basic Part: No; JLCPCB Part Number: C1855060; Supplier 1: LCSC; Category: Capacitors - MLCC; Supplier Part Number 1: C1855060; Voltage Rating: 100V; Temperature Coefficient: NP0; RoHS: Yes; ComponentLink1Description: Datasheet; ComponentLink1URL: https://wmsc.lcsc.com/wmsc/upload/file/pdf/v2/lcsc/2201271230_YAGEO-CQ0402BRNPO0BNR70_C1855060.pdf; ComponentLink2Description: JLCPCB Part URL; ComponentLink2URL: https://jlcpcb.com/partdetail/C1855060; ComponentLink3Description: LCSC Part URL; ComponentLink3URL: https://lcsc.com/product-detail/Multilayer-Ceramic-Capacitors-MLCC---SMD-SMT_YAGEO-YAGEO-CQ0402BRNPO0BNR70_C1855060.html
footprint CAP-0402 (0402 (1005M) Capacitor)
pins: 1, 2

## CQ0402BRNPO9BN1R0
designator C?  Capacitance: 1pF  (hidden comment: *)
Capacitor, Ceramic (MLCC), 1pF, 50V, NP0, SMD 0402; Manufacturer: YAGEO; Manufacturer Part Number: CQ0402BRNPO9BN1R0; Package Size: 0402; JLCPCB Basic Part: No; JLCPCB Part Number: C326069; Supplier 1: LCSC; Category: Capacitors - MLCC; Supplier Part Number 1: C326069; Voltage Rating: 50V; Temperature Coefficient: NP0; RoHS: Yes; ComponentLink1Description: Datasheet; ComponentLink1URL: https://wmsc.lcsc.com/wmsc/upload/file/pdf/v2/lcsc/1811070918_YAGEO-CQ0402BRNPO9BN1R0_C326069.pdf; ComponentLink2Description: JLCPCB Part URL; ComponentLink2URL: https://jlcpcb.com/partdetail/C326069; ComponentLink3Description: LCSC Part URL; ComponentLink3URL: https://lcsc.com/product-detail/Multilayer-Ceramic-Capacitors-MLCC---SMD-SMT_YAGEO-YAGEO-CQ0402BRNPO9BN1R0_C326069.html
footprint CAP-0402 (0402 (1005M) Capacitor)
pins: 1, 2

## CQ0402BRNPO9BN1R2
designator C?  Capacitance: 1.2pF  (hidden comment: *)
Capacitor, Ceramic (MLCC), 1.2pF, 50V, NP0, SMD 0402; Manufacturer: YAGEO; Manufacturer Part Number: CQ0402BRNPO9BN1R2; Package Size: 0402; JLCPCB Basic Part: No; JLCPCB Part Number: C326070; Supplier 1: LCSC; Category: Capacitors - MLCC; Supplier Part Number 1: C326070; Voltage Rating: 50V; Temperature Coefficient: NP0; RoHS: Yes; ComponentLink1Description: Datasheet; ComponentLink1URL: https://wmsc.lcsc.com/wmsc/upload/file/pdf/v2/lcsc/1811031143_YAGEO-CQ0402BRNPO9BN1R2_C326070.pdf; ComponentLink2Description: JLCPCB Part URL; ComponentLink2URL: https://jlcpcb.com/partdetail/C326070; ComponentLink3Description: LCSC Part URL; ComponentLink3URL: https://lcsc.com/product-detail/Multilayer-Ceramic-Capacitors-MLCC---SMD-SMT_YAGEO-YAGEO-CQ0402BRNPO9BN1R2_C326070.html
footprint CAP-0402 (0402 (1005M) Capacitor)
pins: 1, 2

## CQ0402BRNPO9BN1R5
designator C?  Capacitance: 1.5pF  (hidden comment: *)
Capacitor, Ceramic (MLCC), 1.5pF, 50V, NP0, SMD 0402; Manufacturer: YAGEO; Manufacturer Part Number: CQ0402BRNPO9BN1R5; Package Size: 0402; JLCPCB Basic Part: No; JLCPCB Part Number: C577373; Supplier 1: LCSC; Category: Capacitors - MLCC; Supplier Part Number 1: C577373; Voltage Rating: 50V; Temperature Coefficient: NP0; RoHS: Yes; ComponentLink1Description: Datasheet; ComponentLink1URL: https://wmsc.lcsc.com/wmsc/upload/file/pdf/v2/lcsc/2212160808_YAGEO-CQ0402BRNPO9BN1R5_C577373.pdf; ComponentLink2Description: JLCPCB Part URL; ComponentLink2URL: https://jlcpcb.com/partdetail/C577373; ComponentLink3Description: LCSC Part URL; ComponentLink3URL: https://lcsc.com/product-detail/Multilayer-Ceramic-Capacitors-MLCC---SMD-SMT_YAGEO-YAGEO-CQ0402BRNPO9BN1R5_C577373.html
footprint CAP-0402 (0402 (1005M) Capacitor)
pins: 1, 2

## CQ0402BRNPO9BN1R6
designator C?  Capacitance: 1.6pF  (hidden comment: *)
Capacitor, Ceramic (MLCC), 1.6pF, 50V, C0G, SMD 0402; Manufacturer: YAGEO; Manufacturer Part Number: CQ0402BRNPO9BN1R6; Package Size: 0402; JLCPCB Basic Part: No; JLCPCB Part Number: C3856382; Supplier 1: LCSC; Category: Capacitors - MLCC; Supplier Part Number 1: C3856382; Voltage Rating: 50V; Temperature Coefficient: C0G; RoHS: Yes; ComponentLink1Description: Datasheet; ComponentLink1URL: https://wmsc.lcsc.com/wmsc/upload/file/pdf/v2/lcsc/2311211124_YAGEO-CQ0402BRNPO9BN1R6_C3856382.pdf; ComponentLink2Description: JLCPCB Part URL; ComponentLink2URL: https://jlcpcb.com/partdetail/C3856382; ComponentLink3Description: LCSC Part URL; ComponentLink3URL: https://lcsc.com/product-detail/Multilayer-Ceramic-Capacitors-MLCC---SMD-SMT_YAGEO-YAGEO-CQ0402BRNPO9BN1R6_C3856382.html
footprint CAP-0402 (0402 (1005M) Capacitor)
pins: 1, 2

## CQ0402BRNPO9BN1R8
designator C?  Capacitance: 1.8pF  (hidden comment: *)
Capacitor, Ceramic (MLCC), 1.8pF, 50V, NP0, SMD 0402; Manufacturer: YAGEO; Manufacturer Part Number: CQ0402BRNPO9BN1R8; Package Size: 0402; JLCPCB Basic Part: No; JLCPCB Part Number: C469632; Supplier 1: LCSC; Category: Capacitors - MLCC; Supplier Part Number 1: C469632; Voltage Rating: 50V; Temperature Coefficient: NP0; RoHS: Yes; ComponentLink1Description: Datasheet; ComponentLink1URL: https://wmsc.lcsc.com/wmsc/upload/file/pdf/v2/lcsc/2311211124_YAGEO-CQ0402BRNPO9BN1R8_C469632.pdf; ComponentLink2Description: JLCPCB Part URL; ComponentLink2URL: https://jlcpcb.com/partdetail/C469632; ComponentLink3Description: LCSC Part URL; ComponentLink3URL: https://lcsc.com/product-detail/Multilayer-Ceramic-Capacitors-MLCC---SMD-SMT_YAGEO-YAGEO-CQ0402BRNPO9BN1R8_C469632.html
footprint CAP-0402 (0402 (1005M) Capacitor)
pins: 1, 2

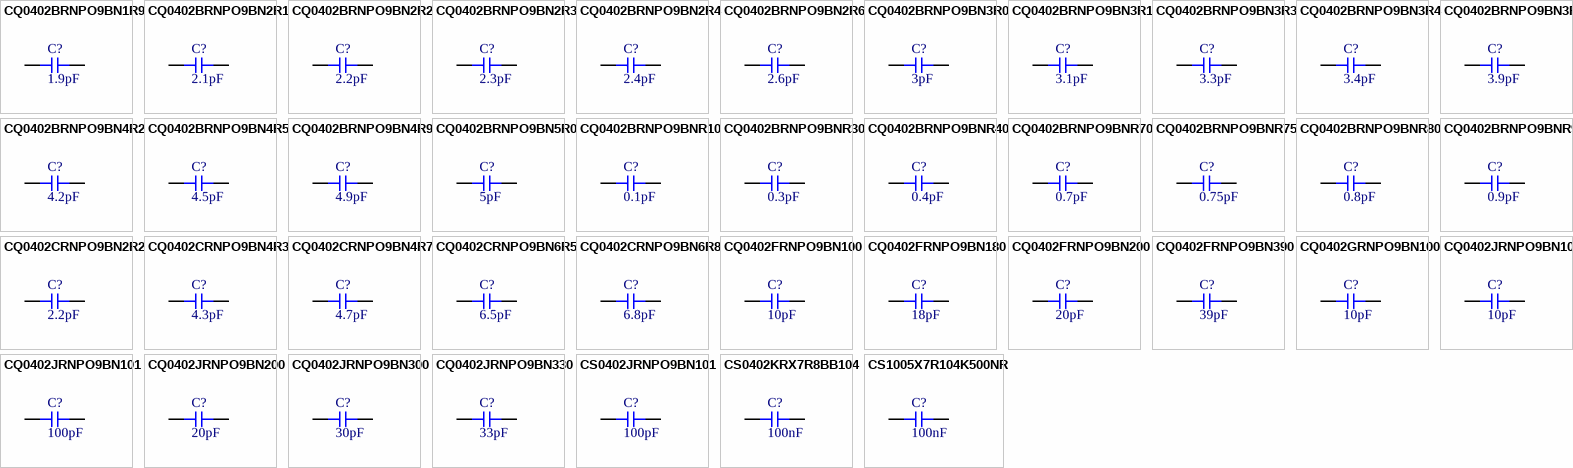
[diagram p50: symbols CQ0402BRNPO9BN1R9 to CS1005X7R104K500NR]
